# Altium footprint library EwgConnectors.PcbLib: 125 footprints (part 7 of 8)
Each footprint in its own frame and in the unit in brackets; x right, y up, seen from the top. Pads: shape width x height; smd on the part's side, far side on the other; paste and mask are expansions set on the pad; w line width, h text height; cw(c..) or ccw(c..) is an arc to the next point about the centre after c.
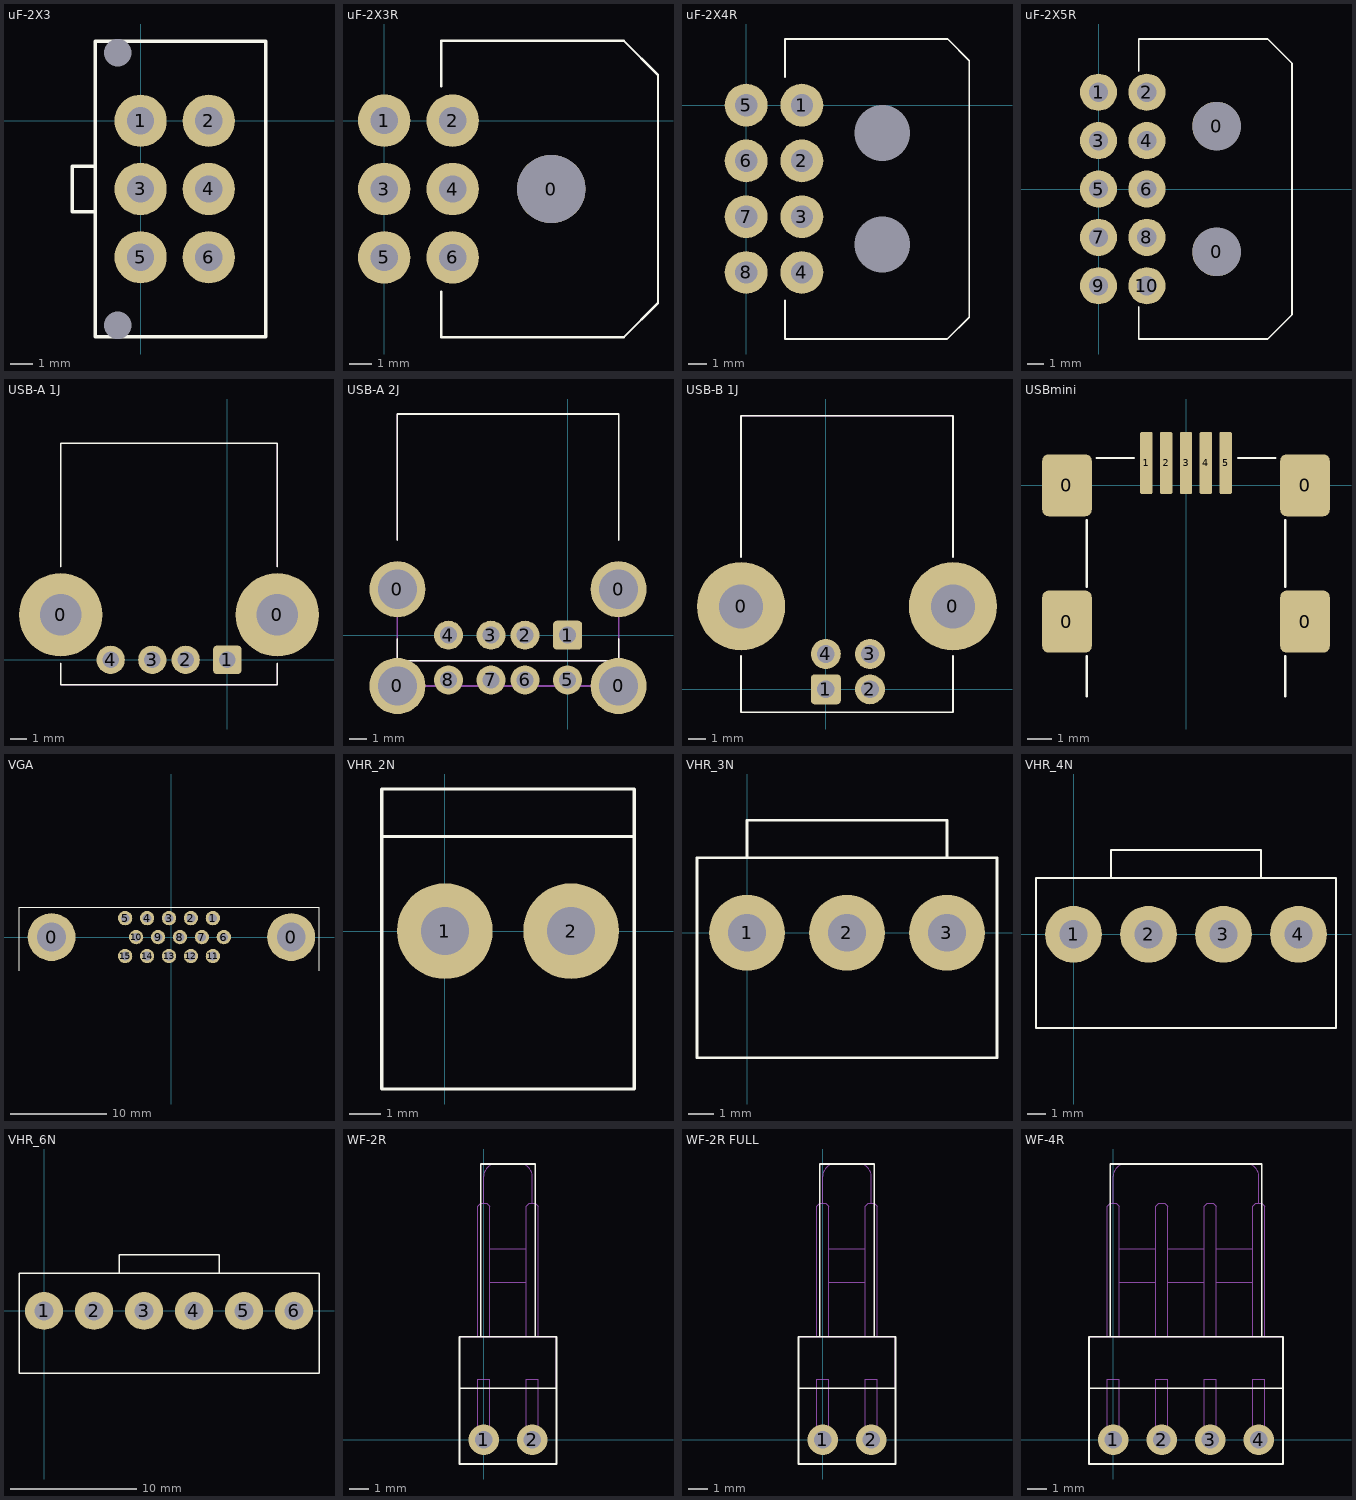
[diagram p6: the footprints below, top view; thin cyan lines are the x and y axes]

## uF-2X3 [mm]
height 10
pads (8):
  round 0 hole 1.2 unplated: 0(-1,-9) 0(-1,3)
  round 2.3 hole 1.2: 1(0,0) 2(3,0) 3(0,-3) 4(3,-3) 5(0,-6) 6(3,-6)
Top Overlay:
  lines w0.15: -2,-4 -3,-4 -3,-2 -2,-2 ; -2,-9.5 -2,3.5 5.5,3.5 5.5,-9.5 -2,-9.5
3D body: height 9.95, standoff -3.14, extent -3.3,-9.575 5.47,3.575

## uF-2X3R [mm]
height 10
pads (7):
  round 3 hole 3 unplated: 0(7.32,-3)
  round 2.3 hole 1.2: 1(0,0) 2(3,0) 3(0,-3) 4(3,-3) 5(0,-6) 6(3,-6)
Top Overlay:
  lines w0.1: 2.5,-7.5 2.5,-9.5 10.5,-9.5 12,-8 12,-3 12,2 10.5,3.5 2.5,3.5 2.5,1.5
3D body: height 8.83, standoff -3.12, extent -0.29,-9.575 11.95,3.575

## uF-2X4R [mm]
height 10
pads (10):
  round 0 hole 3 unplated: 0(7.32,-7.5) 0(7.32,-1.5)
  round 2.3 hole 1.2: 1(3,0) 2(3,-3) 3(3,-6) 4(3,-9) 5(0,0) 6(0,-3) 7(0,-6) 8(0,-9)
Top Overlay:
  lines w0.1: 2.1,-10.5 2.1,-12.579 10.82,-12.579 12,-11.399 12,2.391 10.835,3.556 2.1,3.556 2.1,1.5
3D body: height 8.77, standoff -3.17, extent -0.29,-12.575 11.95,3.575

## uF-2X5R [mm]
height 10
pads (12):
  round 3 hole 3 unplated: 0(7.32,-3.9) 0(7.32,3.9)
  round 2.3 hole 1.2: 1(0,6) 2(3,6) 3(0,3) 4(3,3) 5(0,0) 6(3,0) 7(0,-3) 8(3,-3) 9(0,-6) 10(3,-6)
Top Overlay:
  lines w0.1: 2.5,-7.3 2.5,-9.3 10.5,-9.3 12,-7.8 12,0 12,7.8 10.5,9.3 2.5,9.3 2.5,7.3
3D body: height 8.77, standoff -3.17, extent -0.29,-9.575 11.95,9.575

## USB-A 1J [mm]
pads (6):
  round 5 hole 2.5: 0(-10,2.7) 0(3,2.7)
  rrect25% 1.7x1.7 hole 1: 1(0,0)
  round 1.7 hole 1: 2(-2.5,0) 3(-4.5,0) 4(-7,0)
Top Overlay:
  lines w0.1: -10,-0.2 -10,-1.5 3,-1.5 3,-0.2 ; -10,5.6 -10,13 3,13 3,5.6
Mechanical 1:
  lines w0.05: -10,-0.2 -10,-1.5 3,-1.5 3,-0.3 ; -10,5.6 -10,13 3,13 3,5.6
3D body: height 7.64, standoff -2.84, extent -10.679,-1.016 3.821,12.984

## USB-A 2J [mm]
pads (12):
  round 3.3 hole 2.3: 0(-10,-2.98) 0(-10,2.7) 0(3,-2.98) 0(3,2.7)
  rrect25% 1.7x1.7 hole 1: 1(0,0)
  round 1.7 hole 1: 2(-2.5,0) 3(-4.5,0) 4(-7,0) 5(0,-2.63) 6(-2.5,-2.63) 7(-4.5,-2.63) 8(-7,-2.63)
Top Overlay:
  lines w0.1: -10,-0.2 -10,-1.5 3,-1.5 3,-0.2 ; -10,5.6 -10,13 3,13 3,5.6
Mechanical 1:
  lines w0.05: -10,-0.2 -10,-1.5 3,-1.5 3,-0.3 ; -10,5.6 -10,13 3,13 3,5.6
  lines w0.1: -10,2.7 -10,-2.98 3,-2.98 3,2.7
3D body: height 16.25, standoff -3.15, extent -11.385,-4.045 4.315,13.553

## USB-B 1J [mm]
pads (6):
  round 5 hole 2.5: 0(-4.8,4.7) 0(7.2,4.7)
  rrect25% 1.7x1.7 hole 1: 1(0,0)
  round 1.7 hole 1: 2(2.5,0) 3(2.5,2) 4(0,2)
Top Overlay:
  lines w0.1: -4.8,1.9 -4.8,-1.3 7.2,-1.3 7.2,1.9 ; -4.8,7.5 -4.8,15.5 7.2,15.5 7.2,7.5
Mechanical 1:
  lines w0.05: -4.8,1.9 -4.8,-1.3 7.2,-1.3 7.2,1.9 ; -4.8,7.5 -4.8,15.5 7.2,15.5 7.2,7.5
3D body: height 10.5, standoff -3.72, extent -6.179,-0.9 8.68,15.4

## USBmini [mm]
pads (9):
  rrect25% 2x2.5 smd: 0(-4.8,-5.5) 0(-4.8,0) 0(4.8,-5.5) 0(4.8,0)
  rrect25% 0.5x2.5 smd: 1(-1.6,0.9) 2(-0.8,0.9) 3(0,0.9) 4(0.8,0.9) 5(1.6,0.9)
Top Overlay:
  lines w0.1: -4,-8.5 -4,-6.9 ; -4,-4.1 -4,-1.4 ; -3.6,1.1 -2.1,1.1 ; 2.1,1.1 3.6,1.1 ; 4,-8.5 4,-6.9 ; 4,-4.1 4,-1.4
3D body: height 3.9, standoff -1, extent -4.83,-8.46 4.83,0.94

## VGA [mm]
pads (17):
  round 5 hole 3: 0(-12.5,0) 0(12.5,0)
  round 1.5 hole 0.9: 1(4.33,1.98) 2(2.04,1.98) 3(-0.25,1.98) 4(-2.54,1.98) 5(-4.83,1.98) 6(5.475,0) 7(3.185,0) 8(0.895,0) 9(-1.395,0) 10(-3.685,0) 11(4.33,-1.98) 12(2.04,-1.98) 13(-0.25,-1.98) 14(-2.54,-1.98) 15(-4.83,-1.98)
Top Overlay:
  lines w0.1: -15.9,-3.5 -15.9,3.1 15.4,3.1 ; 15.4,-3.5 15.4,3.1 ; 15.4,3.1 15.4,3.1
3D body: height 11.25, standoff -2.09, extent -15.65,-10.47 15.15,3

## VHR_2N [mm]
pads (2):
  round 3 hole 1.5: 1(0,0) 2(3.96,0)
Top Overlay:
  lines w0.1: -1.98,2.97 -1.98,4.455 5.94,4.455 5.94,2.97 ; -1.98,2.97 -1.98,-4.95 5.94,-4.95 5.94,2.97 ; -1.98,2.97 5.94,2.97

## VHR_3N [mm]
pads (3):
  round 3 hole 1.5: 1(0,0) 2(3.96,0) 3(7.92,0)
Top Overlay:
  lines w0.1: 0,2.97 0,4.455 7.92,4.455 7.92,2.97 ; -1.98,-4.95 9.9,-4.95 9.9,2.97 -1.98,2.97 -1.98,-4.95

## VHR_4N [mm]
pads (4):
  round 3 hole 1.5: 1(0,0) 2(3.96,0) 3(7.92,0) 4(11.88,0)
Top Overlay:
  lines w0.1: 1.98,2.97 1.98,4.455 9.9,4.455 9.9,2.97 ; -1.98,-4.95 -1.98,2.97 13.86,2.97 13.86,-4.95 -1.98,-4.95

## VHR_6N [mm]
pads (6):
  round 3 hole 1.5: 1(0,0) 2(3.96,0) 3(7.92,0) 4(11.88,0) 5(15.84,0) 6(19.8,0)
Top Overlay:
  lines w0.1: 5.94,2.97 5.94,4.455 13.86,4.455 13.86,2.97 ; -1.98,-4.95 -1.98,2.97 21.78,2.97 21.78,-4.95 -1.98,-4.95

## WF-2R [mm]
pads (2):
  round 1.6 hole 0.9: 1(0,0) 2(2.54,0)
Top Overlay:
  lines w0.1: -0.159,5.397 -0.159,14.446 2.699,14.446 2.699,5.397 ; -1.27,2.699 3.81,2.699 ; -1.27,2.699 -1.27,5.397 3.81,5.397 3.81,2.699 ; -1.27,2.699 -1.27,-1.27 3.81,-1.27 3.81,2.699
Mechanical 1:
  lines w0.05: -0.318,5.397 -0.318,12.224 -0.159,12.383 0.159,12.383 0.318,12.224 0.318,5.397 ; 0,12.383 0,13.811 cw(c0.635,13.811) 0.635,14.446 1.905,14.446 cw(c1.905,13.811) 2.54,13.811 2.54,12.383 ; 0.318,8.255 2.222,8.255 ; 0.318,10.001 2.222,10.001 ; 2.222,5.397 2.222,12.224 2.381,12.383 2.699,12.383 2.857,12.224 2.857,5.397 ; -0.318,2.699 -0.318,0 ccw(c0,0) 0.318,0 0.318,2.699 ; -0.318,2.699 -1.27,2.699 -1.27,5.397 3.81,5.397 3.81,2.699 2.857,2.699 ; -0.318,2.699 -0.318,3.175 0.318,3.175 0.318,2.699 ; 0.318,2.699 2.222,2.699 ; 2.222,2.699 2.222,0 ccw(c2.54,0) 2.857,0 2.857,2.699 ; 2.222,2.699 2.222,2.857 2.222,3.175 2.857,3.175 2.857,2.699
3D body: height 5.8, standoff -3.5, extent -1.25,-0.3 3.85,14.425

## WF-2R FULL [mm]
pads (2):
  round 1.6 hole 0.9: 1(0,0) 2(2.54,0)
Top Overlay:
  lines w0.1: -0.159,5.397 -0.159,14.446 2.699,14.446 2.699,5.397 ; -1.27,2.699 -1.27,-1.27 3.81,-1.27 3.81,2.699 ; -1.27,2.699 -1.27,5.397 3.81,5.397 3.81,2.699 ; -1.27,2.699 3.81,2.699
Mechanical 1:
  lines w0.05: -0.318,5.397 -0.318,12.224 -0.159,12.383 0.159,12.383 0.318,12.224 0.318,5.397 ; 0,12.383 0,13.811 cw(c0.635,13.811) 0.635,14.446 1.905,14.446 cw(c1.905,13.811) 2.54,13.811 2.54,12.383 ; 0.318,8.255 2.222,8.255 ; 0.318,10.001 2.222,10.001 ; 2.222,5.397 2.222,12.224 2.381,12.383 2.699,12.383 2.857,12.224 2.857,5.397 ; -0.318,2.699 -0.318,3.175 0.318,3.175 0.318,2.699 ; -0.318,2.699 -1.27,2.699 -1.27,5.397 3.81,5.397 3.81,2.699 2.857,2.699 ; -0.318,2.699 -0.318,0 ccw(c0,0) 0.318,0 0.318,2.699 ; 0.318,2.699 2.222,2.699 ; 2.222,2.699 2.222,2.857 2.222,3.175 2.857,3.175 2.857,2.699 ; 2.222,2.699 2.222,0 ccw(c2.54,0) 2.857,0 2.857,2.699
3D body: height 5.8, standoff -3.5, extent -1.25,-0.3 3.85,14.425
3D body: height -1.1, standoff -6.4, extent -1.5,5.35 4.1,20.05

## WF-4R [mm]
pads (4):
  round 1.6 hole 0.9: 1(0,0) 2(2.54,0) 3(5.08,0) 4(7.62,0)
Top Overlay:
  lines w0.1: -0.159,5.397 -0.159,14.446 7.779,14.446 7.779,5.397 ; -1.27,2.699 -1.27,5.397 8.89,5.397 8.89,2.699 ; -1.27,2.699 -1.27,-1.27 8.89,-1.27 8.89,2.699 ; -1.27,2.699 8.89,2.699
Mechanical 1:
  lines w0.05: -0.318,5.397 -0.318,12.224 -0.159,12.383 0.159,12.383 0.318,12.224 0.318,5.397 ; 0,12.383 0,13.811 cw(c0.635,13.811) 0.635,14.446 6.985,14.446 cw(c6.985,13.811) 7.62,13.811 7.62,12.383 ; 0.318,8.255 2.222,8.255 ; 0.318,10.001 2.222,10.001 ; 2.222,5.397 2.222,12.224 2.381,12.383 2.699,12.383 2.857,12.224 2.857,5.397 ; 2.857,8.255 4.763,8.255 ; 2.857,10.001 4.763,10.001 ; 4.763,5.397 4.763,12.224 4.921,12.383 5.239,12.383 5.397,12.224 5.397,5.397 ; 5.397,8.255 7.302,8.255 ; 5.397,10.001 7.302,10.001 ; 7.302,5.397 7.302,12.224 7.461,12.383 7.779,12.383 7.938,12.224 7.938,5.397 ; -0.318,2.699 -0.318,3.175 0.318,3.175 0.318,2.699 ; -0.318,2.699 -1.27,2.699 -1.27,5.397 8.89,5.397 8.89,2.699 7.938,2.699 ; -0.318,2.699 -0.318,0 ccw(c0,0) 0.318,0 0.318,2.699 ; 0.318,2.699 2.222,2.699 ; 2.222,2.699 2.222,2.857 2.222,3.175 2.857,3.175 2.857,2.699 ; 2.222,2.699 2.222,0 ccw(c2.54,0) 2.857,0 2.857,2.699 ; 2.857,2.699 4.763,2.699 ; 4.763,2.699 4.763,2.857 4.763,3.175 5.397,3.175 5.397,2.699 ; 4.763,2.699 4.763,0 ccw(c5.08,0) 5.397,0 5.397,2.699 ; 5.397,2.699 7.302,2.699 ; 7.302,2.699 7.302,2.857 7.302,3.175 7.938,3.175 7.938,2.699 ; 7.302,2.699 7.302,0 ccw(c7.62,0) 7.938,0 7.938,2.699
3D body: height 5.8, standoff -3.5, extent -1.3,-0.3 8.9,14.425